# Altium footprint library MS-Electronic.PcbLib: 202 footprints (part 10 of 13)
Each footprint in its own frame and in the unit in brackets; x right, y up, seen from the top. Pads: shape width x height; smd on the part's side, far side on the other; paste and mask are expansions set on the pad; w line width, h text height; cw(c..) or ccw(c..) is an arc to the next point about the centre after c.
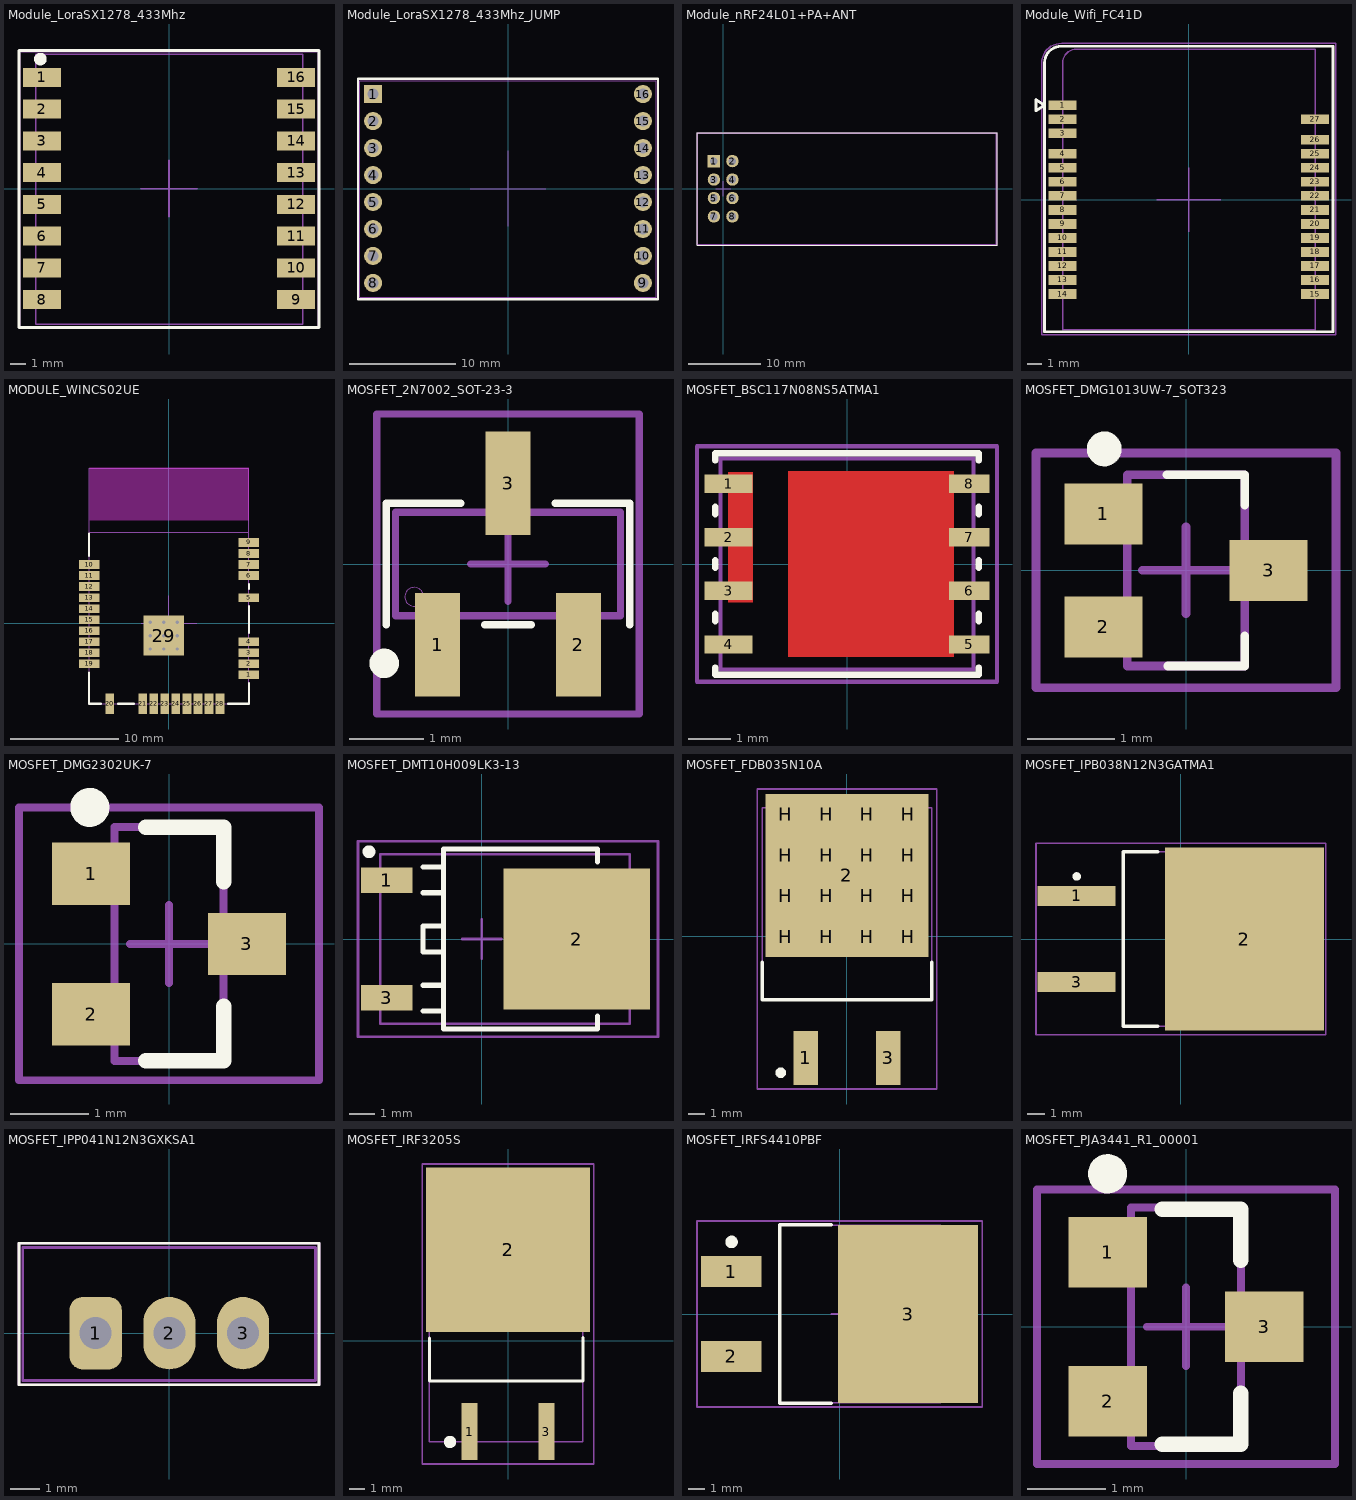
[diagram p9: the footprints below, top view; thin cyan lines are the x and y axes]

## Module_LoraSX1278_433Mhz [mm]
pads (16):
  rect 2.4x1.2 smd: 1(-8,7) 2(-8,5) 3(-8,3) 4(-8,1) 5(-8,-1) 6(-8,-3) 7(-8,-5) 8(-8,-7) 9(8,-7) 10(8,-5) 11(8,-3) 12(8,-1) 13(8,1) 14(8,3) 15(8,5) 16(8,7)
Top Overlay:
  circle w0.4: c-8.103,8.153 r0.2
  lines w0.2: -9.449,-8.742 9.449,-8.742 9.449,8.687 -9.449,8.687 -9.449,-8.742
Top Assembly:
  lines w0.1: -8.382,-8.544 -8.382,8.461 8.425,8.461 8.425,-8.544 -8.382,-8.544
  text ".Designator" at -4.998,-0.333 h1
Top Component Center (Mech15):
  lines w0.1: -1.778,0 0,0 ; 0,-1.778 0,0 ; 0,1.778 0,0 ; 1.778,0 0,0 ; -9.411,-8.712 9.398,-8.712 9.398,8.611 -9.411,8.611 -9.411,-8.712
3D body "LoRa Ra-02 Singel.step": height 3.4, standoff 0, extent -8.382,-8.542 8.418,8.458

## Module_LoraSX1278_433Mhz_JUMP [mm]
pads (16):
  rect 1.7x1.7 hole 1.05: 1(-12.7,8.89)
  round 1.7 hole 1.05: 2(-12.7,6.35) 3(-12.7,3.81) 4(-12.7,1.27) 5(-12.7,-1.27) 6(-12.7,-3.81) 7(-12.7,-6.35) 8(-12.7,-8.89) 9(12.7,-8.89) 10(12.7,-6.35) 11(12.7,-3.81) 12(12.7,-1.27) 13(12.7,1.27) 14(12.7,3.81) 15(12.7,6.35) 16(12.7,8.89)
Top Overlay:
  lines w0.2: -14.122,-10.429 -14.122,10.338 14.122,10.338 14.122,-10.429 -14.122,-10.429
Top Assembly:
  lines w0.1: -13.946,-10.239 -13.946,10.166 13.956,10.166 13.956,-10.239 -13.946,-10.239
  text ".Designator" at -4.998,-0.333 h1
Top Component Center (Mech15):
  lines w0.1: -3.556,0 0,0 ; 0,-3.556 0,0 ; 0,3.556 0,0 ; 3.556,0 0,0 ; -14.071,-10.365 -14.071,10.287 14.077,10.287 14.077,-10.365 -14.071,-10.365
3D body "lora-ra-02-ai-thinker.STEP": height 4.5, standoff -0.1, extent -13.945,-10.236 13.955,10.164

## Module_nRF24L01+PA+ANT [mm]
height 8.54
pads (8):
  rect 1.7x1.7 hole 1.05: 1(-1.27,3.81)
  round 1.7 hole 1.05: 2(1.27,3.81) 3(-1.27,1.27) 4(1.27,1.27) 5(-1.27,-1.27) 6(1.27,-1.27) 7(-1.27,-3.81) 8(1.27,-3.81)
Top Overlay:
  lines w0.1: -3.597,-7.779 37.661,-7.779 37.661,7.722 -3.597,7.722 -3.597,-7.779
Top Assembly:
  lines w0.1: -3.468,-7.65 -3.468,7.604 37.532,7.604 37.532,-7.65 -3.468,-7.65
  text ".Designator" at -3.999,-0.216 h0.8
Top Component Center (Mech15):
  lines w0.1: -1.016,0 0,0 ; 0,-1.016 0,0 ; 0,1.016 0,0 ; 1.016,0 0,0 ; -3.597,-7.779 37.661,-7.779 37.661,7.722 -3.597,7.722 -3.597,-7.779
3D body "NRF24l01_with_antenna.STEP": height 93.15, standoff -5.54, extent -3.47,-7.649 70.495,7.601

## Module_Wifi_FC41D [mm]
pads (27):
  rect 2x0.7 smd paste-0.4 mask+0.05: 1(-9,6.73) 2(-9,5.73) 3(-9,4.73) 4(-9,3.27) 5(-9,2.27) 6(-9,1.27) 7(-9,0.27) 8(-9,-0.73) 9(-9,-1.73) 10(-9,-2.73) 11(-9,-3.73) 12(-9,-4.73) 13(-9,-5.73) 14(-9,-6.73) 15(9,-6.73) 16(9,-5.73) 17(9,-4.73) 18(9,-3.73) 19(9,-2.73) 20(9,-1.73) 21(9,-0.73) 22(9,0.27) 23(9,1.27) 24(9,2.27) 25(9,3.27) 26(9,4.27) 27(9,5.73)
Top Overlay:
  lines w0.2: -10.897,6.331 -10.297,6.731 -10.897,7.131 -10.897,6.331 ; -10.287,-9.42 -10.287,9.743 cw(c-9.096,9.743) -9.096,10.934 10.274,10.934 10.274,-9.42 -10.287,-9.42
Top Assembly:
  lines w0.1: -9,-9.27 -9,9.73 cw(c-8,9.73) -8,10.73 9,10.73 9,-9.27 -9,-9.27
  text ".Designator" at -9.997,-0.666 h2
Top Component Center (Mech15):
  lines w0.1: -2.286,0 0,0 ; 0,-2.286 0,0 ; 0,2.286 0,0 ; 2.286,0 0,0 ; -10.49,-9.626 10.486,-9.626 10.486,11.138 -9.073,11.138 ccw(c-9.088,9.736) -10.49,9.751 -10.49,-9.626
3D body "FC41D--3DModel-STEP-269445.STEP": height 2.6, standoff 0, extent -9.008,-9.271 8.992,10.729

## MODULE_WINCS02UE [mm]
pads (29):
  rect 1.9x0.8 smd: 1(7.366,-4.763) 2(7.366,-3.746) 3(7.366,-2.73) 4(7.366,-1.714) 5(7.366,2.349) 6(7.366,4.381) 7(7.366,5.397) 8(7.366,6.413) 9(7.366,7.429) 10(-7.366,5.397) 11(-7.366,4.381) 12(-7.366,3.365) 13(-7.366,2.349) 14(-7.366,1.333) 15(-7.366,0.318) 16(-7.366,-0.699) 17(-7.366,-1.714) 18(-7.366,-2.73) 19(-7.366,-3.746)
  rect 0.8x1.9 smd: 20(-5.461,-7.429) 21(-2.413,-7.429) 22(-1.397,-7.429) 23(-0.381,-7.429) 24(0.635,-7.429) 25(1.651,-7.429) 26(2.667,-7.429) 27(3.683,-7.429) 28(4.699,-7.429)
  rect 3.7x3.7 smd: 29(-0.484,-1.159)
via -0.484,-1.159 diameter 0.6 hole 0.3
via -1.717,-2.393 diameter 0.6 hole 0.3
via -0.484,-2.393 diameter 0.6 hole 0.3
via -1.717,0.074 diameter 0.6 hole 0.3
via -0.484,0.074 diameter 0.6 hole 0.3
via 0.749,0.074 diameter 0.6 hole 0.3
via -1.717,-1.159 diameter 0.6 hole 0.3
via 0.749,-1.159 diameter 0.6 hole 0.3
via 0.749,-2.393 diameter 0.6 hole 0.3
Top Overlay:
  lines w0.2: -7.366,-4.547 -7.366,-7.429 -6.261,-7.429 ; -7.366,6.198 -7.366,8.23 ; -4.704,-7.429 -3.213,-7.429 ; 5.469,-7.429 7.366,-7.429 7.366,-5.533 ; 7.366,-0.914 7.366,1.549 ; 7.366,3.15 7.366,3.581
Keep-Out Layer:
  region: 7.391,9.475 7.391,14.338 -7.341,14.338 -7.341,9.475
Top Assembly:
  text ".Designator" at -4.998,-0.333 h1
Top 3D Body:
  lines w0.1: -7.366,-7.429 7.366,-7.429 7.366,14.287 -7.366,14.287 -7.366,-7.429
Top Component Center (Mech15):
  lines w0.1: -7.366,8.381 7.366,8.381 ; -2.54,0 0,0 ; 0,-2.54 0,0 ; 0,2.54 0,0 ; 2.54,0 0,0 ; -7.366,-7.429 -7.366,14.287 7.366,14.287 7.366,-7.429 -7.366,-7.429
3D body "RNWF02_WILCS02_WINCS02_Module_R2.0.step": height 2.15, standoff 0.01, extent -7.366,-7.43 7.366,14.287

## MOSFET_2N7002_SOT-23-3 [mil]
pads (3):
  rect 24x55.12 smd paste+0: 1(-37.5,-43) 2(37.5,-43) 3(0,43)
Top Overlay:
  circle w7.87: c-66,-53 r3.94
  lines w3.94: -65,-32.5 -65,32.5 -25.1,32.5 ; -12.4,-32.5 12.4,-32.5 ; 25.1,32.5 65,32.5 65,-32.5
Top Assembly:
  lines w3.94: -60,-27.5 -60,27.5 60,27.5 60,-27.5 -60,-27.5
  text ".Designator" at -98.39,-6.56 h19.68
Top 3D Body:
  circle w0: c-50,-17.5 r5
Top Component Center (Mech15):
  lines w3.94: -20,0 0,0 ; 0,-20 0,0 ; 0,20 0,0 ; 20,0 0,0 ; -70,-80 70,-80 70,80 -70,80 -70,-80
3D body "SOT-23TO-236_318-08_ONS.step": height 44.09, standoff 0, extent -60,-52.01 60,52.01

## MOSFET_BSC117N08NS5ATMA1 [mil]
pads (8):
  rect 45x17 smd paste+0: 1(-110.5,75) 2(-110.5,25) 3(-110.5,-25) 4(-110.5,-75)
  rect 38x17 smd paste+0: 5(114,-75) 6(114,-25) 7(114,25) 8(114,75)
Top Layer:
  region: 99.5,86.5 -55,86.5 -55,-86.5 99.5,-86.5
  region: -111,85.5 -88,85.5 -88,-35.5 -111,-35.5
Top Overlay:
  lines w6: -123,-96.6 -123,-103.5 123,-103.5 123,-96.6 ; -123,-53.4 -123,-46.6 ; -123,-3.4 -123,3.4 ; -123,46.6 -123,53.4 ; -123,96.6 -123,103.5 123,103.5 123,96.6 ; 123,-53.4 123,-46.6 ; 123,-3.4 123,3.4 ; 123,46.6 123,53.4
Top Paste:
  region: 95,86.5 -55,86.5 -55,-86.5 95,-86.5
  region: -111,85.5 -88,85.5 -88,-35.5 -111,-35.5
  region: 71.06,-32.77 28.94,-32.77 28.94,-82.56 71.06,-82.56
  region: 71.06,24.9 28.94,24.9 28.94,-24.9 71.06,-24.9
  region: 71.06,82.56 28.94,82.56 28.94,32.77 71.06,32.77
  region: 21.06,-32.77 -21.06,-32.77 -21.06,-82.56 21.06,-82.56
  region: 21.06,24.9 -21.06,24.9 -21.06,-24.9 21.06,-24.9
  region: 21.06,82.56 -21.06,82.56 -21.06,32.77 21.06,32.77
  region: -28.94,-32.77 -71.06,-32.77 -71.06,-82.56 -28.94,-82.56
  region: -28.94,24.9 -71.06,24.9 -71.06,-24.9 -28.94,-24.9
  region: -28.94,82.56 -71.06,82.56 -71.06,32.77 -28.94,32.77
Top Solder:
  region: 95,86.5 -55,86.5 -55,-86.5 95,-86.5
  region: -111,85.5 -88,85.5 -88,-35.5 -111,-35.5
Top Assembly:
  lines w3.94: -118,-98.5 -118,98.5 118,98.5 118,-98.5 -118,-98.5
  text ".Designator" at -98.39,-6.56 h19.68
Top Component Center (Mech15):
  lines w3.94: -24.9,0 0,0 ; 0,-24.9 0,0 ; 0,24.9 0,0 ; 24.9,0 0,0 ; -140,-110 -140,110 140,110 140,-110 -140,-110
3D body "BSC117N08NS5ATMA1.step": height 47.24, standoff 0, extent -121.26,-105.02 121.26,105.02

## MOSFET_DMG1013UW-7_SOT323 [mm]
height 1.1
pads (3):
  rect 0.9x0.7 smd: 1(-0.95,0.65) 2(-0.95,-0.65) 3(0.95,0)
Top Overlay:
  circle w0.2: c-0.94,1.397 r0.1
  lines w0.1: -0.218,1.1 0.675,1.1 0.675,0.75 ; -0.206,-1.1 0.675,-1.1 0.675,-0.75
Top Assembly:
  lines w0.1: -0.675,-1.1 0.675,-1.1 0.675,1.1 -0.675,1.1 -0.675,-1.1
  text ".Designator" at -2.499,-0.167 h0.5
Top Component Center (Mech15):
  lines w0.1: -0.5,0 0.5,0 ; 0,-0.5 0,0.5 ; -1.725,-1.35 1.725,-1.35 1.725,1.35 -1.725,1.35 -1.725,-1.35
3D body "MOSFET_DMG1013UW-7_SOT323.step": height 1.1, standoff 0, extent -1.1,-1.1 1.1,1.1

## MOSFET_DMG2302UK-7 [mm]
height 1.1
pads (3):
  rect 1x0.8 smd: 1(-1,0.9) 2(-1,-0.9) 3(1,0)
Top Overlay:
  circle w0.25: c-1.016,1.753 r0.125
  lines w0.2: -0.3,-1.5 0.7,-1.5 0.7,-0.8 ; -0.3,1.5 0.7,1.5 0.7,0.8
Top Assembly:
  lines w0.1: -0.7,-1.5 -0.7,1.5 0.7,1.5 0.7,-1.5 -0.7,-1.5
  text ".Designator" at -2.499,-0.167 h0.5
Top Component Center (Mech15):
  lines w0.1: -0.5,0 0.5,0 ; 0,-0.5 0,0.5 ; -1.925,-1.75 -1.925,1.75 1.925,1.75 1.925,-1.75 -1.925,-1.75
3D body "MOSFET_DMG2302UK-7.step": height 1.1, standoff 0, extent -1.31,-1.5 1.31,1.5

## MOSFET_DMT10H009LK3-13 [mm]
height 2.29
pads (3):
  rect 2x1 smd: 1(-3.7,2.285) 3(-3.7,-2.285)
  rect 5.7x5.5 smd: 2(3.7,0)
Top Overlay:
  circle w0.25: c-4.4,3.4 r0.125
  lines w0.2: -2.286,-2.8 -1.5,-2.8 -1.5,-1.8 -2.286,-1.8 ; -2.286,1.8 -1.5,1.8 -1.5,2.8 -2.286,2.8 ; 4.5,-3 4.5,-3.5 -1.5,-3.5 -1.5,3.5 4.5,3.5 4.5,3 ; -2.3,-0.5 -1.5,-0.5 -1.5,0.5 -2.3,0.5 -2.3,-0.5
Top Assembly:
  lines w0.1: -3.962,-3.302 -3.962,3.302 5.766,3.302 5.766,-3.302 -3.962,-3.302
  text ".Designator" at -4.998,-0.333 h1
Top Component Center (Mech15):
  lines w0.1: -0.762,0 0,0 ; 0,-0.762 0,0 ; 0,0.762 0,0 ; 0.762,0 0,0 ; -4.826,-3.81 -4.826,3.81 6.858,3.81 6.858,-3.81 -4.826,-3.81
3D body "DPAK.stp": height 2.31, standoff 0, extent -3.951,-3.3 5.762,3.3

## MOSFET_FDB035N10A [mm]
pads (19):
  rect 1.5x3.3 smd mask+0.07: 1(-2.54,-7.47) 3(2.54,-7.47)
  rect 10x10 smd paste-10 mask+0.07: 2(0,3.72)
  rect 2x2 on Top Paste: H(-3.75,-0.03) H(-3.75,2.47) H(-3.75,4.97) H(-3.75,7.47) H(-1.25,-0.03) H(-1.25,2.47) H(-1.25,4.97) H(-1.25,7.47) H(1.25,-0.03) H(1.25,2.47) H(1.25,4.97) H(1.25,7.47) H(3.75,-0.03) H(3.75,2.47) H(3.75,4.97) H(3.75,7.47)
Top Overlay:
  circle w0.4: c-4.064,-8.382 r0.125
  lines w0.2: -5.2,-1.605 -5.2,-3.905 5.2,-3.905 5.2,-1.605
Top Assembly:
  lines w0.1: -5.2,-3.905 -5.2,7.874 5.2,7.874 5.2,-3.905 -5.2,-3.905
  text ".Designator" at -2.499,-0.172 h0.5
Top Component Center (Mech15):
  lines w0.1: -0.5,0 0.5,0 ; 0,-0.5 0,0.5 ; -5.5,-9.38 -5.5,9.02 5.5,9.02 5.5,-1.18 5.5,-9.38 -5.5,-9.38
3D body "to-263.STEP": height 4.3, standoff 0, extent -5,-7.983 5,7.897

## MOSFET_IPB038N12N3GATMA1 [mm]
height 4.58
pads (3):
  rect 4.6x1.2 smd: 1(-6.15,2.54) 3(-6.15,-2.54)
  rect 9.4x10.8 smd: 2(3.75,0)
Top Overlay:
  circle w0.25: c-6.15,3.69 r0.125
  lines w0.2: -1.35,-5.15 -3.4,-5.15 -3.4,5.15 -1.35,5.15
Top Assembly:
  lines w0.1: -3.4,-5.15 6.05,-5.15 6.05,5.15 -3.4,5.15 -3.4,-5.15
  text ".Designator" at -2.499,-0.167 h0.5
Top Component Center (Mech15):
  lines w0.1: -0.5,0 0.5,0 ; 0,-0.5 0,0.5 ; -8.55,-5.65 8.55,-5.65 8.55,5.65 -8.55,5.65 -8.55,-5.65
3D body "MOSFET_IPB038N12N3GATMA1.step": height 4.57, standoff 0, extent -7.19,-5.15 8.05,5.15

## MOSFET_IPP041N12N3GXKSA1 [mm]
pads (3):
  rrect50% 1.8x2.5 hole 1.1: 1(-2.54,0)
  oval 1.8x2.5 hole 1.1: 2(0,0) 3(2.54,0)
Top Overlay:
  lines w0.1: -5.182,-1.778 -5.182,3.099 5.156,3.099 5.156,-1.778 -5.182,-1.778
Top Assembly:
  lines w0.1: -5.052,-1.626 5.033,-1.626 5.033,2.946 -5.052,2.946 -5.052,-1.626
  text ".Designator" at -2.499,-0.167 h0.5
Top Component Center (Mech15):
  lines w0.1: -0.762,0 0,0 ; 0,-0.762 0,0 ; 0,0.762 0,0 ; 0.762,0 0,0 ; -5.182,-1.778 -5.182,3.099 5.156,3.099 5.156,-1.778 -5.182,-1.778
3D body "IPP041N12N3GXKSA1.stp": height 20.18, standoff -17.96, extent -5.015,-1.626 5.015,2.944

## MOSFET_IRF3205S [mm]
pads (3):
  rect 1.06x3.78 smd mask+0.102: 1(-2.54,-6.01) 3(2.54,-6.01)
  rect 10.84x10.88 smd paste-6: 2(0,6.01)
Top Overlay:
  circle w0.5: c-3.835,-6.69 r0.155
  lines w0.2: -5.197,0.185 -5.197,-2.652 4.958,-2.652 4.958,0.209
Top Paste:
  region: -3.9,8.13 -3.9,6.61 -5.15,6.61 -5.15,8.13
  region: -3.9,5.5 -3.9,3.98 -5.15,3.98 -5.15,5.5
  region: -3.9,2.87 -3.9,1.35 -5.15,1.35 -5.15,2.87
  region: -2.09,8.13 -2.09,6.61 -3.34,6.61 -3.34,8.13
  region: -2.09,5.5 -2.09,3.98 -3.34,3.98 -3.34,5.5
  region: -2.09,2.87 -2.09,1.35 -3.34,1.35 -3.34,2.87
  region: 5.15,8.13 5.15,6.61 3.9,6.61 3.9,8.13
  region: 5.15,5.5 5.15,3.98 3.9,3.98 3.9,5.5
  region: 5.15,2.87 5.15,1.35 3.9,1.35 3.9,2.87
  region: 3.34,8.13 3.34,6.61 2.09,6.61 2.09,8.13
  region: 3.34,5.5 3.34,3.98 2.09,3.98 2.09,5.5
  region: 3.34,2.87 3.34,1.35 2.09,1.35 2.09,2.87
  region: 1.53,8.13 1.53,6.61 0.28,6.61 0.28,8.13
  region: 1.53,5.5 1.53,3.98 0.28,3.98 0.28,5.5
  region: 1.53,2.87 1.53,1.35 0.28,1.35 0.28,2.87
  region: -0.28,8.13 -0.28,6.61 -1.53,6.61 -1.53,8.13
  region: -0.28,5.5 -0.28,3.98 -1.53,3.98 -1.53,5.5
  region: -0.28,2.87 -0.28,1.35 -1.53,1.35 -1.53,2.87
Top Assembly:
  lines w0.1: -5.207,-6.69 -5.207,8.55 4.953,8.55 4.953,-6.69 -5.207,-6.69
  text ".Designator" at -3.999,-0.267 h0.8
Top Component Center (Mech15):
  lines w0.1: -5.67,-8.15 -5.67,11.684 5.67,11.684 5.67,-8.15 -5.67,-8.15

## MOSFET_IRFS4410PBF [mm]
height 4.83
pads (3):
  rect 3.65x1.85 smd: 1(-6.5,2.54) 2(-6.5,-2.54)
  rect 8.4x10.65 smd: 3(4.1,0)
Top Overlay:
  circle w0.5: c-6.477,4.318 r0.125
  lines w0.2: -0.5,-5.35 -3.6,-5.35 -3.6,5.35 -0.5,5.35
Top Assembly:
  lines w0.1: -3.6,-5.325 -3.6,5.325 6.05,5.325 6.05,-5.325 -3.6,-5.325
  text ".Designator" at -2.999,-0.2 h0.6
Top Component Center (Mech15):
  lines w0.1: -0.5,0 0.5,0 ; 0,-0.5 0,0.5 ; -8.55,-5.575 -8.55,5.575 8.55,5.575 8.55,-5.575 -8.55,-5.575

## MOSFET_PJA3441_R1_00001 [mm]
height 1.1
pads (3):
  rect 1x0.9 smd: 1(-1,0.95) 2(-1,-0.95) 3(1,0)
Top Overlay:
  circle w0.25: c-1,1.95 r0.125
  lines w0.2: -0.3,-1.5 0.7,-1.5 0.7,-0.85 ; -0.3,1.5 0.7,1.5 0.7,0.85
Top Assembly:
  lines w0.1: -0.7,-1.52 -0.7,1.52 0.7,1.52 0.7,-1.52 -0.7,-1.52
  text ".Designator" at -1.999,-0.133 h0.4
Top Component Center (Mech15):
  lines w0.1: -0.5,0 0.5,0 ; 0,-0.5 0,0.5 ; -1.9,-1.75 -1.9,1.75 1.9,1.75 1.9,-1.75 -1.9,-1.75
3D body "MOSFET_PJA3441_R1_00001.step": height 1.1, standoff 0, extent -1.35,-1.52 1.35,1.52